# Altium schematic symbol library 场效应管.SchLib: 1062 symbols (part 1 of 4)
Pins are listed as number, name and electrical type; pins without a type are passive.

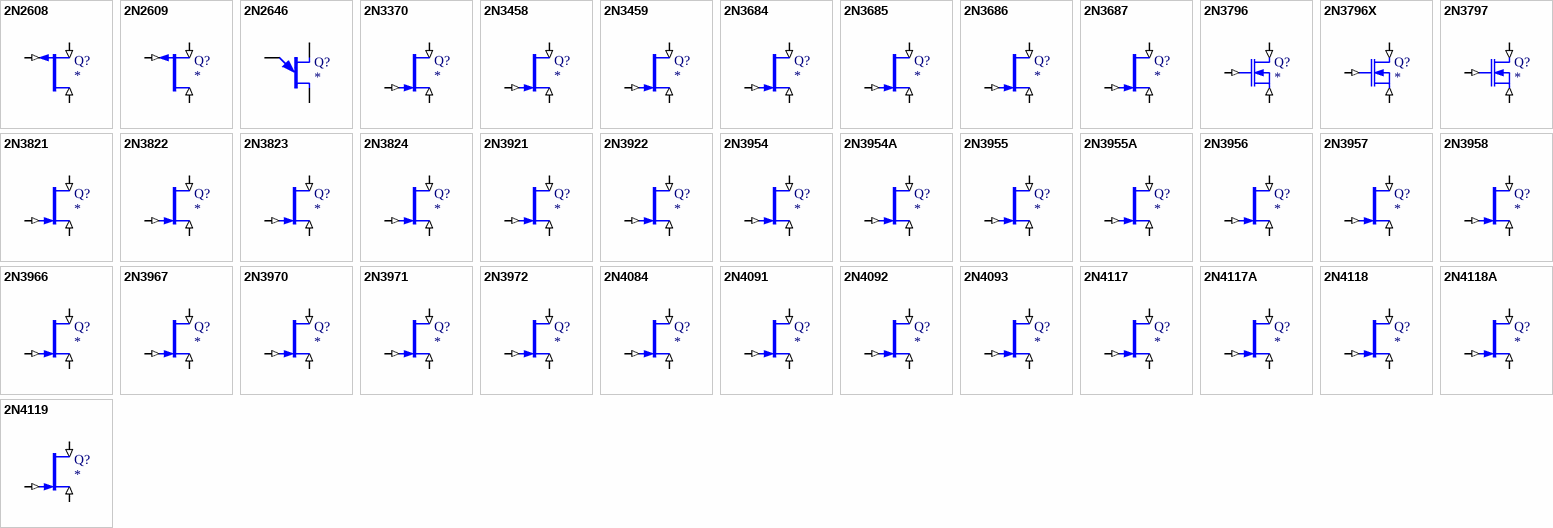
[diagram p0: symbols 2N2608 to 2N4119]

## 2N2608
designator Q?
P-Channel JFET
simulation model 2N2608 (PJFET)
pins: 1 D (in), 2 G (in), 3 S (in)
1 alternate drawing of the same symbol

## 2N2609
designator Q?
P-Channel JFET
simulation model 2N2609 (PJFET)
pins: 1 D (in), 2 G (in), 3 S (in)
1 alternate drawing of the same symbol

## 2N2646
designator Q?
Unijunction Transistor
simulation model 2N2646 (SUBCKT)
pins: 1 B2, 2 E, 3 B1
1 alternate drawing of the same symbol

## 2N3370
designator Q?
N-Channel JFET
simulation model 2N3370 (NJFET)
pins: 1 D (in), 2 G (in), 3 S (in)
1 alternate drawing of the same symbol

## 2N3458
designator Q?
N-Channel JFET
simulation model 2N3458 (NJFET)
pins: 1 D (in), 2 G (in), 3 S (in)
1 alternate drawing of the same symbol

## 2N3459
designator Q?
N-Channel JFET
simulation model 2N3459 (NJFET)
pins: 1 D (in), 2 G (in), 3 S (in)
1 alternate drawing of the same symbol

## 2N3684
designator Q?
N-Channel JFET
simulation model 2N3684 (NJFET)
pins: 1 D (in), 2 G (in), 3 S (in)
1 alternate drawing of the same symbol

## 2N3685
designator Q?
N-Channel JFET
simulation model 2N3685 (NJFET)
pins: 1 D (in), 2 G (in), 3 S (in)
1 alternate drawing of the same symbol

## 2N3686
designator Q?
N-Channel JFET
simulation model 2N3686 (NJFET)
pins: 1 D (in), 2 G (in), 3 S (in)
1 alternate drawing of the same symbol

## 2N3687
designator Q?
N-Channel JFET
simulation model 2N3687 (NJFET)
pins: 1 D (in), 2 G (in), 3 S (in)
1 alternate drawing of the same symbol

## 2N3796
designator Q?
N-Channel MOSFET; TEMP: *
simulation model 2N3796 (NEMOS)
pins: 1 D (in), 2 G (in), 3 S (in)
1 alternate drawing of the same symbol

## 2N3796X
designator Q?
N-Channel MOSFET; TEMP: *
simulation model 2N3796X (NEMOS)
pins: 1 D (in), 2 G (in), 3 S (in)
1 alternate drawing of the same symbol

## 2N3797
designator Q?
N-Channel MOSFET; TEMP: *
simulation model 2N3797 (NEMOS)
pins: 1 D (in), 2 G (in), 3 S (in)
1 alternate drawing of the same symbol

## 2N3821
designator Q?
N-Channel JFET
simulation model 2N3821 (NJFET)
pins: 1 D (in), 2 G (in), 3 S (in)
1 alternate drawing of the same symbol

## 2N3822
designator Q?
N-Channel JFET
simulation model 2N3822 (NJFET)
pins: 1 D (in), 2 G (in), 3 S (in)
1 alternate drawing of the same symbol

## 2N3823
designator Q?
N-Channel JFET
simulation model 2N3823 (NJFET)
pins: 1 D (in), 2 G (in), 3 S (in)
1 alternate drawing of the same symbol

## 2N3824
designator Q?
N-Channel JFET
simulation model 2N3824 (NJFET)
pins: 1 D (in), 2 G (in), 3 S (in)
1 alternate drawing of the same symbol

## 2N3921
designator Q?
N-Channel JFET
simulation model 2N3921 (NJFET)
pins: 1 D (in), 2 G (in), 3 S (in)
1 alternate drawing of the same symbol

## 2N3922
designator Q?
N-Channel JFET
simulation model 2N3922 (NJFET)
pins: 1 D (in), 2 G (in), 3 S (in)
1 alternate drawing of the same symbol

## 2N3954
designator Q?
N-Channel JFET
simulation model 2N3954 (NJFET)
pins: 1 D (in), 2 G (in), 3 S (in)
1 alternate drawing of the same symbol

## 2N3954A
designator Q?
N-Channel JFET
simulation model 2N3954A (NJFET)
pins: 1 D (in), 2 G (in), 3 S (in)
1 alternate drawing of the same symbol

## 2N3955
designator Q?
N-Channel JFET
simulation model 2N3955 (NJFET)
pins: 1 D (in), 2 G (in), 3 S (in)
1 alternate drawing of the same symbol

## 2N3955A
designator Q?
N-Channel JFET
simulation model 2N3955A (NJFET)
pins: 1 D (in), 2 G (in), 3 S (in)
1 alternate drawing of the same symbol

## 2N3956
designator Q?
N-Channel JFET
simulation model 2N3956 (NJFET)
pins: 1 D (in), 2 G (in), 3 S (in)
1 alternate drawing of the same symbol

## 2N3957
designator Q?
N-Channel JFET
simulation model 2N3957 (NJFET)
pins: 1 D (in), 2 G (in), 3 S (in)
1 alternate drawing of the same symbol

## 2N3958
designator Q?
N-Channel JFET
simulation model 2N3958 (NJFET)
pins: 1 D (in), 2 G (in), 3 S (in)
1 alternate drawing of the same symbol

## 2N3966
designator Q?
N-Channel JFET
simulation model 2N3966 (NJFET)
pins: 1 D (in), 2 G (in), 3 S (in)
1 alternate drawing of the same symbol

## 2N3967
designator Q?
N-Channel JFET
simulation model 2N3967 (NJFET)
pins: 1 D (in), 2 G (in), 3 S (in)
1 alternate drawing of the same symbol

## 2N3970
designator Q?
N-Channel JFET
simulation model 2N3970 (NJFET)
pins: 1 D (in), 2 G (in), 3 S (in)
1 alternate drawing of the same symbol

## 2N3971
designator Q?
N-Channel JFET
simulation model 2N3971 (NJFET)
pins: 1 D (in), 2 G (in), 3 S (in)
1 alternate drawing of the same symbol

## 2N3972
designator Q?
N-Channel JFET
simulation model 2N3972 (NJFET)
pins: 1 D (in), 2 G (in), 3 S (in)
1 alternate drawing of the same symbol

## 2N4084
designator Q?
N-Channel JFET
simulation model 2N4084 (NJFET)
pins: 1 D (in), 2 G (in), 3 S (in)
1 alternate drawing of the same symbol

## 2N4091
designator Q?
N-Channel JFET
simulation model 2N4091 (NJFET)
pins: 1 D (in), 2 G (in), 3 S (in)
1 alternate drawing of the same symbol

## 2N4092
designator Q?
N-Channel JFET
simulation model 2N4092 (NJFET)
pins: 1 D (in), 2 G (in), 3 S (in)
1 alternate drawing of the same symbol

## 2N4093
designator Q?
N-Channel JFET
simulation model 2N4093 (NJFET)
pins: 1 D (in), 2 G (in), 3 S (in)
1 alternate drawing of the same symbol

## 2N4117
designator Q?
N-Channel JFET
simulation model 2N4117 (NJFET)
pins: 1 D (in), 2 G (in), 3 S (in)
1 alternate drawing of the same symbol

## 2N4117A
designator Q?
N-Channel JFET
simulation model 2N4117A (NJFET)
pins: 1 D (in), 2 G (in), 3 S (in)
1 alternate drawing of the same symbol

## 2N4118
designator Q?
N-Channel JFET
simulation model 2N4118 (NJFET)
pins: 1 D (in), 2 G (in), 3 S (in)
1 alternate drawing of the same symbol

## 2N4118A
designator Q?
N-Channel JFET
simulation model 2N4118A (NJFET)
pins: 1 D (in), 2 G (in), 3 S (in)
1 alternate drawing of the same symbol

## 2N4119
designator Q?
N-Channel JFET
simulation model 2N4119 (NJFET)
pins: 1 D (in), 2 G (in), 3 S (in)
1 alternate drawing of the same symbol

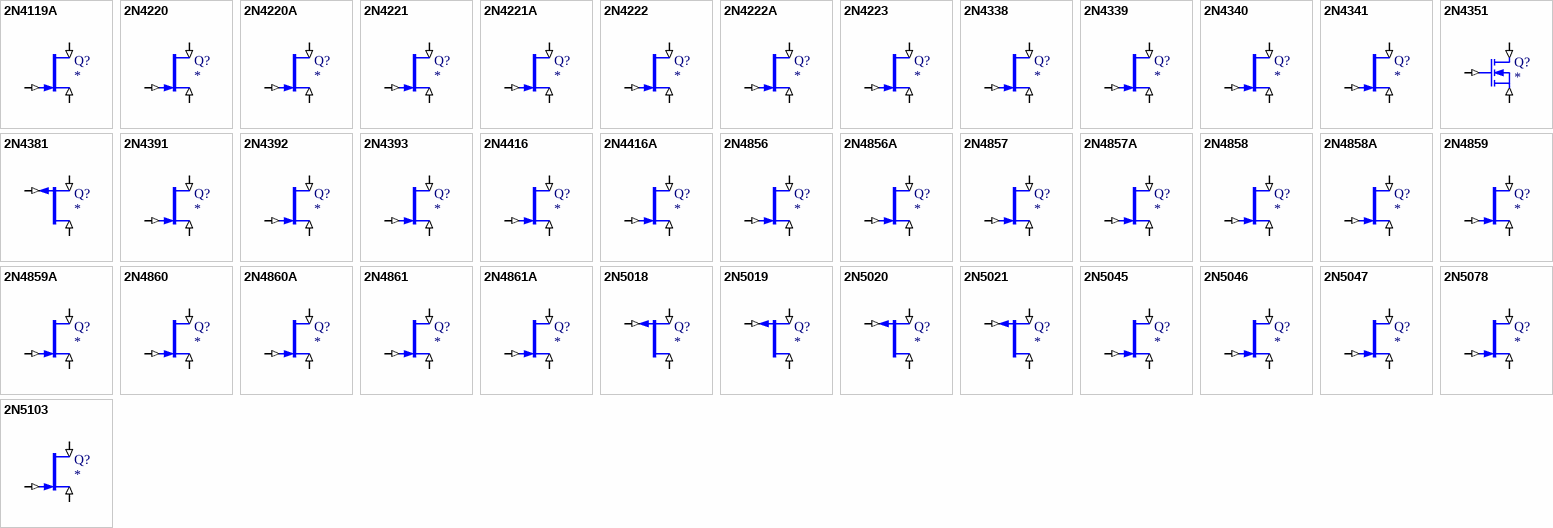
[diagram p1: symbols 2N4119A to 2N5103]

## 2N4119A
designator Q?
N-Channel JFET
simulation model 2N4119A (NJFET)
pins: 1 D (in), 2 G (in), 3 S (in)
1 alternate drawing of the same symbol

## 2N4220
designator Q?
N-Channel JFET
simulation model 2N4220 (NJFET)
pins: 1 D (in), 2 G (in), 3 S (in)
1 alternate drawing of the same symbol

## 2N4220A
designator Q?
N-Channel JFET
simulation model 2N4220A (NJFET)
pins: 1 D (in), 2 G (in), 3 S (in)
1 alternate drawing of the same symbol

## 2N4221
designator Q?
N-Channel JFET
simulation model 2N4221 (NJFET)
pins: 1 D (in), 2 G (in), 3 S (in)
1 alternate drawing of the same symbol

## 2N4221A
designator Q?
N-Channel JFET
simulation model 2N4221A (NJFET)
pins: 1 D (in), 2 G (in), 3 S (in)
1 alternate drawing of the same symbol

## 2N4222
designator Q?
N-Channel JFET
simulation model 2N4222 (NJFET)
pins: 1 D (in), 2 G (in), 3 S (in)
1 alternate drawing of the same symbol

## 2N4222A
designator Q?
N-Channel JFET
simulation model 2N4222A (NJFET)
pins: 1 D (in), 2 G (in), 3 S (in)
1 alternate drawing of the same symbol

## 2N4223
designator Q?
N-Channel JFET
simulation model 2N4223 (NJFET)
pins: 1 D (in), 2 G (in), 3 S (in)
1 alternate drawing of the same symbol

## 2N4338
designator Q?
N-Channel JFET
simulation model 2N4338 (NJFET)
pins: 1 D (in), 2 G (in), 3 S (in)
1 alternate drawing of the same symbol

## 2N4339
designator Q?
N-Channel JFET
simulation model 2N4339 (NJFET)
pins: 1 D (in), 2 G (in), 3 S (in)
1 alternate drawing of the same symbol

## 2N4340
designator Q?
N-Channel JFET
simulation model 2N4340 (NJFET)
pins: 1 D (in), 2 G (in), 3 S (in)
1 alternate drawing of the same symbol

## 2N4341
designator Q?
N-Channel JFET
simulation model 2N4341 (NJFET)
pins: 1 D (in), 2 G (in), 3 S (in)
1 alternate drawing of the same symbol

## 2N4351
designator Q?
N-Channel MOSFET; TEMP: *
simulation model 2N4351 (NEMOS)
pins: 1 D (in), 2 G (in), 3 S (in)
1 alternate drawing of the same symbol

## 2N4381
designator Q?
P-Channel JFET
simulation model 2N4381 (PJFET)
pins: 1 D (in), 2 G (in), 3 S (in)
1 alternate drawing of the same symbol

## 2N4391
designator Q?
N-Channel JFET
simulation model 2N4391 (NJFET)
pins: 1 D (in), 2 G (in), 3 S (in)
1 alternate drawing of the same symbol

## 2N4392
designator Q?
N-Channel JFET
simulation model 2N4392 (NJFET)
pins: 1 D (in), 2 G (in), 3 S (in)
1 alternate drawing of the same symbol

## 2N4393
designator Q?
N-Channel JFET
simulation model 2N4393 (NJFET)
pins: 1 D (in), 2 G (in), 3 S (in)
1 alternate drawing of the same symbol

## 2N4416
designator Q?
N-Channel JFET
simulation model 2N4416 (NJFET)
pins: 1 D (in), 2 G (in), 3 S (in)
1 alternate drawing of the same symbol

## 2N4416A
designator Q?
N-Channel JFET
simulation model 2N4416A (NJFET)
pins: 1 D (in), 2 G (in), 3 S (in)
1 alternate drawing of the same symbol

## 2N4856
designator Q?
N-Channel JFET
simulation model 2N4856 (NJFET)
pins: 1 D (in), 2 G (in), 3 S (in)
1 alternate drawing of the same symbol

## 2N4856A
designator Q?
N-Channel JFET
simulation model 2N4856A (NJFET)
pins: 1 D (in), 2 G (in), 3 S (in)
1 alternate drawing of the same symbol

## 2N4857
designator Q?
N-Channel JFET
simulation model 2N4857 (NJFET)
pins: 1 D (in), 2 G (in), 3 S (in)
1 alternate drawing of the same symbol

## 2N4857A
designator Q?
N-Channel JFET
simulation model 2N4857A (NJFET)
pins: 1 D (in), 2 G (in), 3 S (in)
1 alternate drawing of the same symbol

## 2N4858
designator Q?
N-Channel JFET
simulation model 2N4858 (NJFET)
pins: 1 D (in), 2 G (in), 3 S (in)
1 alternate drawing of the same symbol

## 2N4858A
designator Q?
N-Channel JFET
simulation model 2N4858A (NJFET)
pins: 1 D (in), 2 G (in), 3 S (in)
1 alternate drawing of the same symbol

## 2N4859
designator Q?
N-Channel JFET
simulation model 2N4859 (NJFET)
pins: 1 D (in), 2 G (in), 3 S (in)
1 alternate drawing of the same symbol

## 2N4859A
designator Q?
N-Channel JFET
simulation model 2N4859A (NJFET)
pins: 1 D (in), 2 G (in), 3 S (in)
1 alternate drawing of the same symbol

## 2N4860
designator Q?
N-Channel JFET
simulation model 2N4860 (NJFET)
pins: 1 D (in), 2 G (in), 3 S (in)
1 alternate drawing of the same symbol

## 2N4860A
designator Q?
N-Channel JFET
simulation model 2N4860A (NJFET)
pins: 1 D (in), 2 G (in), 3 S (in)
1 alternate drawing of the same symbol

## 2N4861
designator Q?
N-Channel JFET
simulation model 2N4861 (NJFET)
pins: 1 D (in), 2 G (in), 3 S (in)
1 alternate drawing of the same symbol

## 2N4861A
designator Q?
N-Channel JFET
simulation model 2N4861A (NJFET)
pins: 1 D (in), 2 G (in), 3 S (in)
1 alternate drawing of the same symbol

## 2N5018
designator Q?
P-Channel JFET
simulation model 2N5018 (PJFET)
pins: 1 D (in), 2 G (in), 3 S (in)
1 alternate drawing of the same symbol

## 2N5019
designator Q?
P-Channel JFET
simulation model 2N5019 (PJFET)
pins: 1 D (in), 2 G (in), 3 S (in)
1 alternate drawing of the same symbol

## 2N5020
designator Q?
P-Channel JFET
simulation model 2N5020 (PJFET)
pins: 1 D (in), 2 G (in), 3 S (in)
1 alternate drawing of the same symbol

## 2N5021
designator Q?
P-Channel JFET
simulation model 2N5021 (PJFET)
pins: 1 D (in), 2 G (in), 3 S (in)
1 alternate drawing of the same symbol

## 2N5045
designator Q?
N-Channel JFET
simulation model 2N5045 (NJFET)
pins: 1 D (in), 2 G (in), 3 S (in)
1 alternate drawing of the same symbol

## 2N5046
designator Q?
N-Channel JFET
simulation model 2N5046 (NJFET)
pins: 1 D (in), 2 G (in), 3 S (in)
1 alternate drawing of the same symbol

## 2N5047
designator Q?
N-Channel JFET
simulation model 2N5047 (NJFET)
pins: 1 D (in), 2 G (in), 3 S (in)
1 alternate drawing of the same symbol

## 2N5078
designator Q?
N-Channel JFET
simulation model 2N5078 (NJFET)
pins: 1 D (in), 2 G (in), 3 S (in)
1 alternate drawing of the same symbol

## 2N5103
designator Q?
N-Channel JFET
simulation model 2N5103 (NJFET)
pins: 1 D (in), 2 G (in), 3 S (in)
1 alternate drawing of the same symbol

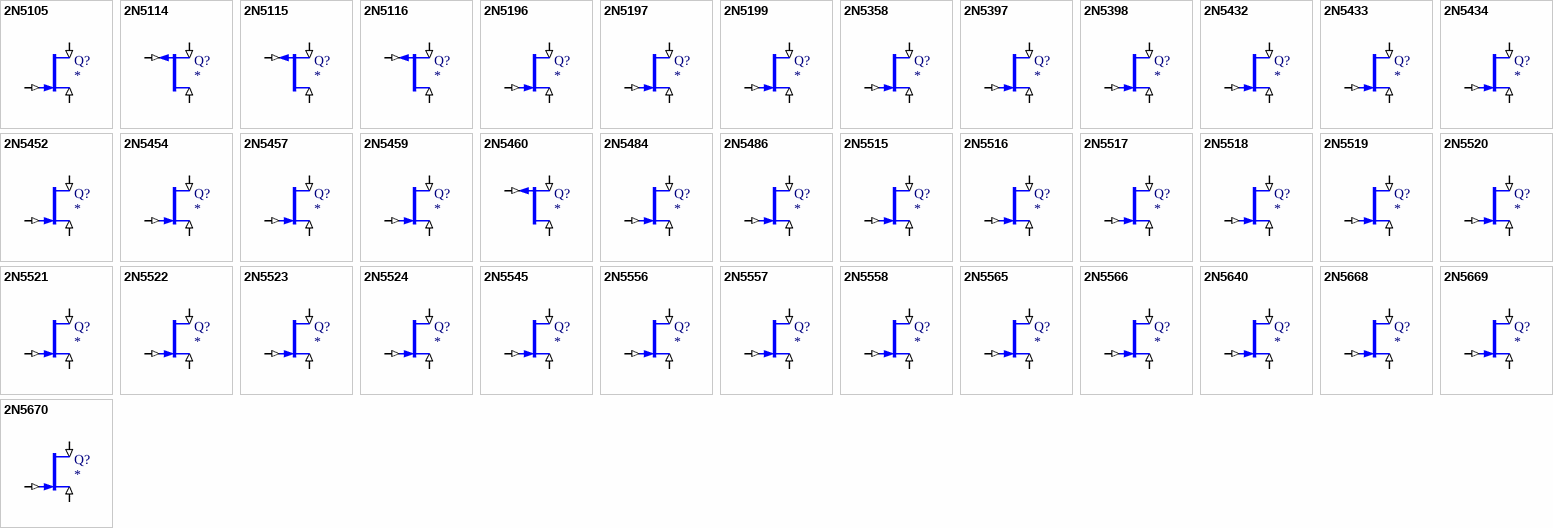
[diagram p2: symbols 2N5105 to 2N5670]

## 2N5105
designator Q?
N-Channel JFET
simulation model 2N5105 (NJFET)
pins: 1 D (in), 2 G (in), 3 S (in)
1 alternate drawing of the same symbol

## 2N5114
designator Q?
P-Channel JFET
simulation model 2N5114 (PJFET)
pins: 1 D (in), 2 G (in), 3 S (in)
1 alternate drawing of the same symbol

## 2N5115
designator Q?
P-Channel JFET
simulation model 2N5115 (PJFET)
pins: 1 D (in), 2 G (in), 3 S (in)
1 alternate drawing of the same symbol

## 2N5116
designator Q?
P-Channel JFET
simulation model 2N5116 (PJFET)
pins: 1 D (in), 2 G (in), 3 S (in)
1 alternate drawing of the same symbol

## 2N5196
designator Q?
N-Channel JFET
simulation model 2N5196 (NJFET)
pins: 1 D (in), 2 G (in), 3 S (in)
1 alternate drawing of the same symbol

## 2N5197
designator Q?
N-Channel JFET
simulation model 2N5197 (NJFET)
pins: 1 D (in), 2 G (in), 3 S (in)
1 alternate drawing of the same symbol

## 2N5199
designator Q?
N-Channel JFET
simulation model 2N5199 (NJFET)
pins: 1 D (in), 2 G (in), 3 S (in)
1 alternate drawing of the same symbol

## 2N5358
designator Q?
N-Channel JFET
simulation model 2N5358 (NJFET)
pins: 1 D (in), 2 G (in), 3 S (in)
1 alternate drawing of the same symbol

## 2N5397
designator Q?
N-Channel JFET
simulation model 2N5397 (NJFET)
pins: 1 D (in), 2 G (in), 3 S (in)
1 alternate drawing of the same symbol

## 2N5398
designator Q?
N-Channel JFET
simulation model 2N5398 (NJFET)
pins: 1 D (in), 2 G (in), 3 S (in)
1 alternate drawing of the same symbol

## 2N5432
designator Q?
N-Channel JFET
simulation model 2N5432 (NJFET)
pins: 1 D (in), 2 G (in), 3 S (in)
1 alternate drawing of the same symbol

## 2N5433
designator Q?
N-Channel JFET
simulation model 2N5433 (NJFET)
pins: 1 D (in), 2 G (in), 3 S (in)
1 alternate drawing of the same symbol

## 2N5434
designator Q?
N-Channel JFET
simulation model 2N5434 (NJFET)
pins: 1 D (in), 2 G (in), 3 S (in)
1 alternate drawing of the same symbol

## 2N5452
designator Q?
N-Channel JFET
simulation model 2N5452 (NJFET)
pins: 1 D (in), 2 G (in), 3 S (in)
1 alternate drawing of the same symbol

## 2N5454
designator Q?
N-Channel JFET
simulation model 2N5454 (NJFET)
pins: 1 D (in), 2 G (in), 3 S (in)
1 alternate drawing of the same symbol

## 2N5457
designator Q?
N-Channel JFET
simulation model 2N5457 (NJFET)
pins: 1 D (in), 2 G (in), 3 S (in)
1 alternate drawing of the same symbol

## 2N5459
designator Q?
N-Channel JFET
simulation model 2N5459 (NJFET)
pins: 1 D (in), 2 G (in), 3 S (in)
1 alternate drawing of the same symbol

## 2N5460
designator Q?
P-Channel JFET
simulation model 2N5460 (PJFET)
pins: 1 D (in), 2 G (in), 3 S (in)
1 alternate drawing of the same symbol

## 2N5484
designator Q?
N-Channel JFET
simulation model 2N5484 (NJFET)
pins: 1 D (in), 2 G (in), 3 S (in)
1 alternate drawing of the same symbol

## 2N5486
designator Q?
N-Channel JFET
simulation model 2N5486 (NJFET)
pins: 1 D (in), 2 G (in), 3 S (in)
1 alternate drawing of the same symbol

## 2N5515
designator Q?
N-Channel JFET
simulation model 2N5515 (NJFET)
pins: 1 D (in), 2 G (in), 3 S (in)
1 alternate drawing of the same symbol

## 2N5516
designator Q?
N-Channel JFET
simulation model 2N5516 (NJFET)
pins: 1 D (in), 2 G (in), 3 S (in)
1 alternate drawing of the same symbol

## 2N5517
designator Q?
N-Channel JFET
simulation model 2N5517 (NJFET)
pins: 1 D (in), 2 G (in), 3 S (in)
1 alternate drawing of the same symbol

## 2N5518
designator Q?
N-Channel JFET
simulation model 2N5518 (NJFET)
pins: 1 D (in), 2 G (in), 3 S (in)
1 alternate drawing of the same symbol

## 2N5519
designator Q?
N-Channel JFET
simulation model 2N5519 (NJFET)
pins: 1 D (in), 2 G (in), 3 S (in)
1 alternate drawing of the same symbol

## 2N5520
designator Q?
N-Channel JFET
simulation model 2N5520 (NJFET)
pins: 1 D (in), 2 G (in), 3 S (in)
1 alternate drawing of the same symbol

## 2N5521
designator Q?
N-Channel JFET
simulation model 2N5521 (NJFET)
pins: 1 D (in), 2 G (in), 3 S (in)
1 alternate drawing of the same symbol

## 2N5522
designator Q?
N-Channel JFET
simulation model 2N5522 (NJFET)
pins: 1 D (in), 2 G (in), 3 S (in)
1 alternate drawing of the same symbol

## 2N5523
designator Q?
N-Channel JFET
simulation model 2N5523 (NJFET)
pins: 1 D (in), 2 G (in), 3 S (in)
1 alternate drawing of the same symbol

## 2N5524
designator Q?
N-Channel JFET
simulation model 2N5524 (NJFET)
pins: 1 D (in), 2 G (in), 3 S (in)
1 alternate drawing of the same symbol

## 2N5545
designator Q?
N-Channel JFET
simulation model 2N5545 (NJFET)
pins: 1 D (in), 2 G (in), 3 S (in)
1 alternate drawing of the same symbol

## 2N5556
designator Q?
N-Channel JFET
simulation model 2N5556 (NJFET)
pins: 1 D (in), 2 G (in), 3 S (in)
1 alternate drawing of the same symbol

## 2N5557
designator Q?
N-Channel JFET
simulation model 2N5557 (NJFET)
pins: 1 D (in), 2 G (in), 3 S (in)
1 alternate drawing of the same symbol

## 2N5558
designator Q?
N-Channel JFET
simulation model 2N5558 (NJFET)
pins: 1 D (in), 2 G (in), 3 S (in)
1 alternate drawing of the same symbol

## 2N5565
designator Q?
N-Channel JFET
simulation model 2N5565 (NJFET)
pins: 1 D (in), 2 G (in), 3 S (in)
1 alternate drawing of the same symbol

## 2N5566
designator Q?
N-Channel JFET
simulation model 2N5566 (NJFET)
pins: 1 D (in), 2 G (in), 3 S (in)
1 alternate drawing of the same symbol

## 2N5640
designator Q?
N-Channel JFET
simulation model 2N5640 (NJFET)
pins: 1 D (in), 2 G (in), 3 S (in)
1 alternate drawing of the same symbol

## 2N5668
designator Q?
N-Channel JFET
simulation model 2N5668 (NJFET)
pins: 1 D (in), 2 G (in), 3 S (in)
1 alternate drawing of the same symbol

## 2N5669
designator Q?
N-Channel JFET
simulation model 2N5669 (NJFET)
pins: 1 D (in), 2 G (in), 3 S (in)
1 alternate drawing of the same symbol

## 2N5670
designator Q?
N-Channel JFET
simulation model 2N5670 (NJFET)
pins: 1 D (in), 2 G (in), 3 S (in)
1 alternate drawing of the same symbol

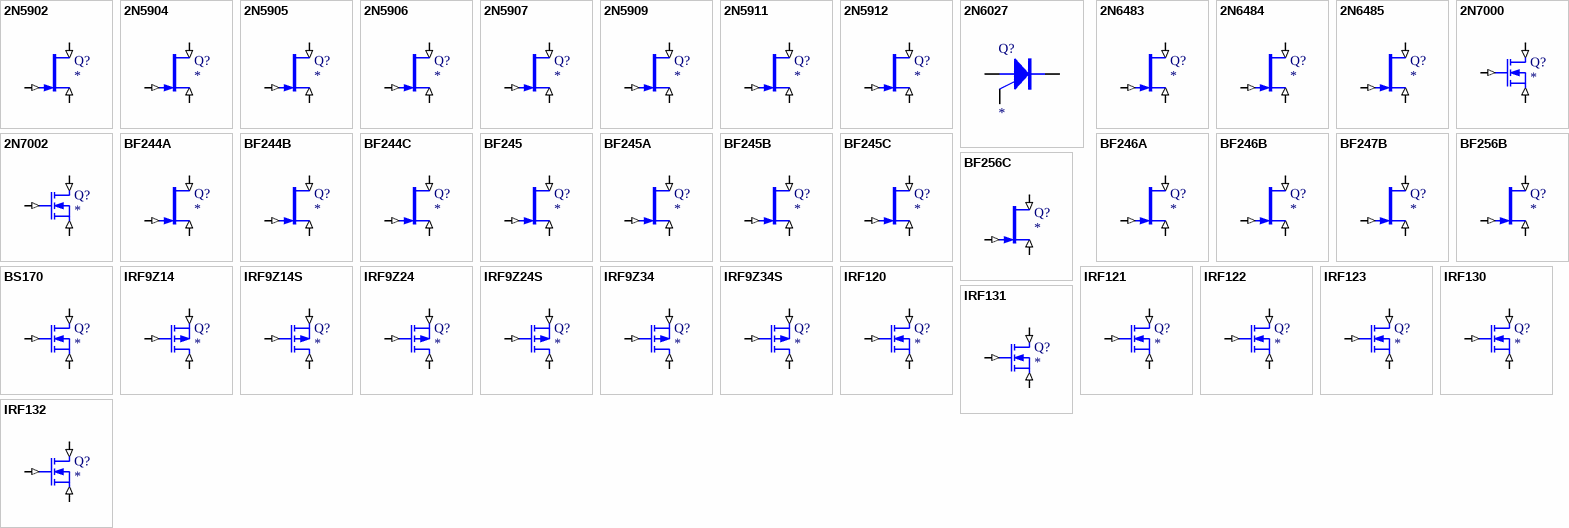
[diagram p3: symbols 2N5902 to IRF132]

## 2N5902
designator Q?
N-Channel JFET
simulation model 2N5902 (NJFET)
pins: 1 D (in), 2 G (in), 3 S (in)
1 alternate drawing of the same symbol

## 2N5904
designator Q?
N-Channel JFET
simulation model 2N5904 (NJFET)
pins: 1 D (in), 2 G (in), 3 S (in)
1 alternate drawing of the same symbol

## 2N5905
designator Q?
N-Channel JFET
simulation model 2N5905 (NJFET)
pins: 1 D (in), 2 G (in), 3 S (in)
1 alternate drawing of the same symbol

## 2N5906
designator Q?
N-Channel JFET
simulation model 2N5906 (NJFET)
pins: 1 D (in), 2 G (in), 3 S (in)
1 alternate drawing of the same symbol

## 2N5907
designator Q?
N-Channel JFET
simulation model 2N5907 (NJFET)
pins: 1 D (in), 2 G (in), 3 S (in)
1 alternate drawing of the same symbol

## 2N5909
designator Q?
N-Channel JFET
simulation model 2N5909 (NJFET)
pins: 1 D (in), 2 G (in), 3 S (in)
1 alternate drawing of the same symbol

## 2N5911
designator Q?
N-Channel JFET
simulation model 2N5911 (NJFET)
pins: 1 D (in), 2 G (in), 3 S (in)
1 alternate drawing of the same symbol

## 2N5912
designator Q?
N-Channel JFET
simulation model 2N5912 (NJFET)
pins: 1 D (in), 2 G (in), 3 S (in)
1 alternate drawing of the same symbol

## 2N6027
designator Q?
Programmable Unijunction Transistor
simulation model 2N6027 (SUBCKT)
pins: 1 A, 2 G, 3 K
1 alternate drawing of the same symbol

## 2N6483
designator Q?
N-Channel JFET
simulation model 2N6483 (NJFET)
pins: 1 D (in), 2 G (in), 3 S (in)
1 alternate drawing of the same symbol

## 2N6484
designator Q?
N-Channel JFET
simulation model 2N6484 (NJFET)
pins: 1 D (in), 2 G (in), 3 S (in)
1 alternate drawing of the same symbol

## 2N6485
designator Q?
N-Channel JFET
simulation model 2N6485 (NJFET)
pins: 1 D (in), 2 G (in), 3 S (in)
1 alternate drawing of the same symbol

## 2N7000
designator Q?
N-Channel MOSFET
simulation model 2N7000 (SUBCKT)
pins: 1 D (in), 2 G (in), 3 S (in)
1 alternate drawing of the same symbol

## 2N7002
designator Q?
N-Channel MOSFET
simulation model 2N7002 (SUBCKT)
pins: 1 D (in), 2 G (in), 3 S (in)
1 alternate drawing of the same symbol

## BF244A
designator Q?
N-Channel JFET
simulation model BF244A (NJFET)
pins: 1 D (in), 2 G (in), 3 S (in)
1 alternate drawing of the same symbol

## BF244B
designator Q?
N-Channel JFET
simulation model BF244B (NJFET)
pins: 1 D (in), 2 G (in), 3 S (in)
1 alternate drawing of the same symbol

## BF244C
designator Q?
N-Channel JFET
simulation model BF244C (NJFET)
pins: 1 D (in), 2 G (in), 3 S (in)
1 alternate drawing of the same symbol

## BF245
designator Q?
N-Channel JFET
simulation model BF245 (NJFET)
pins: 1 D (in), 2 G (in), 3 S (in)
1 alternate drawing of the same symbol

## BF245A
designator Q?
N-Channel JFET
simulation model BF245A (NJFET)
pins: 1 D (in), 2 G (in), 3 S (in)
1 alternate drawing of the same symbol

## BF245B
designator Q?
N-Channel JFET
simulation model BF245B (NJFET)
pins: 1 D (in), 2 G (in), 3 S (in)
1 alternate drawing of the same symbol

## BF245C
designator Q?
N-Channel JFET
simulation model BF245C (NJFET)
pins: 1 D (in), 2 G (in), 3 S (in)
1 alternate drawing of the same symbol

## BF246A
designator Q?
N-Channel JFET
simulation model BF246A (NJFET)
pins: 1 D (in), 2 G (in), 3 S (in)
1 alternate drawing of the same symbol

## BF246B
designator Q?
N-Channel JFET
simulation model BF246B (NJFET)
pins: 1 D (in), 2 G (in), 3 S (in)
1 alternate drawing of the same symbol

## BF247B
designator Q?
N-Channel JFET
simulation model BF247B (NJFET)
pins: 1 D (in), 2 G (in), 3 S (in)
1 alternate drawing of the same symbol

## BF256B
designator Q?
N-Channel JFET
simulation model BF256B (NJFET)
pins: 1 D (in), 2 G (in), 3 S (in)
1 alternate drawing of the same symbol

## BF256C
designator Q?
N-Channel JFET
simulation model BF256C (NJFET)
pins: 1 D (in), 2 G (in), 3 S (in)
1 alternate drawing of the same symbol

## BS170
designator Q?
N-Channel MOSFET
simulation model BS170 (SUBCKT)
pins: 1 D (in), 2 G (in), 3 S (in)
1 alternate drawing of the same symbol

## IRF9Z14
designator Q?
P-Channel MOSFET
simulation model IRF9Z14 (SUBCKT)
pins: 1 D (in), 2 G (in), 3 S (in)
1 alternate drawing of the same symbol

## IRF9Z14S
designator Q?
P-Channel MOSFET
simulation model IRF9Z14S (SUBCKT)
pins: 1 D (in), 2 G (in), 3 S (in)
1 alternate drawing of the same symbol

## IRF9Z24
designator Q?
P-Channel MOSFET
simulation model IRF9Z24 (SUBCKT)
pins: 1 D (in), 2 G (in), 3 S (in)
1 alternate drawing of the same symbol

## IRF9Z24S
designator Q?
P-Channel MOSFET
simulation model IRF9Z24S (SUBCKT)
pins: 1 D (in), 2 G (in), 3 S (in)
1 alternate drawing of the same symbol

## IRF9Z34
designator Q?
P-Channel MOSFET
simulation model IRF9Z34 (SUBCKT)
pins: 1 D (in), 2 G (in), 3 S (in)
1 alternate drawing of the same symbol

## IRF9Z34S
designator Q?
P-Channel MOSFET
simulation model IRF9Z34S (SUBCKT)
pins: 1 D (in), 2 G (in), 3 S (in)
1 alternate drawing of the same symbol

## IRF120
designator Q?
N-Channel MOSFET
simulation model IRF120 (SUBCKT)
pins: 1 D (in), 2 G (in), 3 S (in)
1 alternate drawing of the same symbol

## IRF121
designator Q?
N-Channel MOSFET
simulation model IRF121 (SUBCKT)
pins: 1 D (in), 2 G (in), 3 S (in)
1 alternate drawing of the same symbol

## IRF122
designator Q?
N-Channel MOSFET
simulation model IRF122 (SUBCKT)
pins: 1 D (in), 2 G (in), 3 S (in)
1 alternate drawing of the same symbol

## IRF123
designator Q?
N-Channel MOSFET
simulation model IRF123 (SUBCKT)
pins: 1 D (in), 2 G (in), 3 S (in)
1 alternate drawing of the same symbol

## IRF130
designator Q?
N-Channel MOSFET
simulation model IRF130 (SUBCKT)
pins: 1 D (in), 2 G (in), 3 S (in)
1 alternate drawing of the same symbol

## IRF131
designator Q?
N-Channel MOSFET
simulation model IRF131 (SUBCKT)
pins: 1 D (in), 2 G (in), 3 S (in)
1 alternate drawing of the same symbol

## IRF132
designator Q?
N-Channel MOSFET
simulation model IRF132 (SUBCKT)
pins: 1 D (in), 2 G (in), 3 S (in)
1 alternate drawing of the same symbol

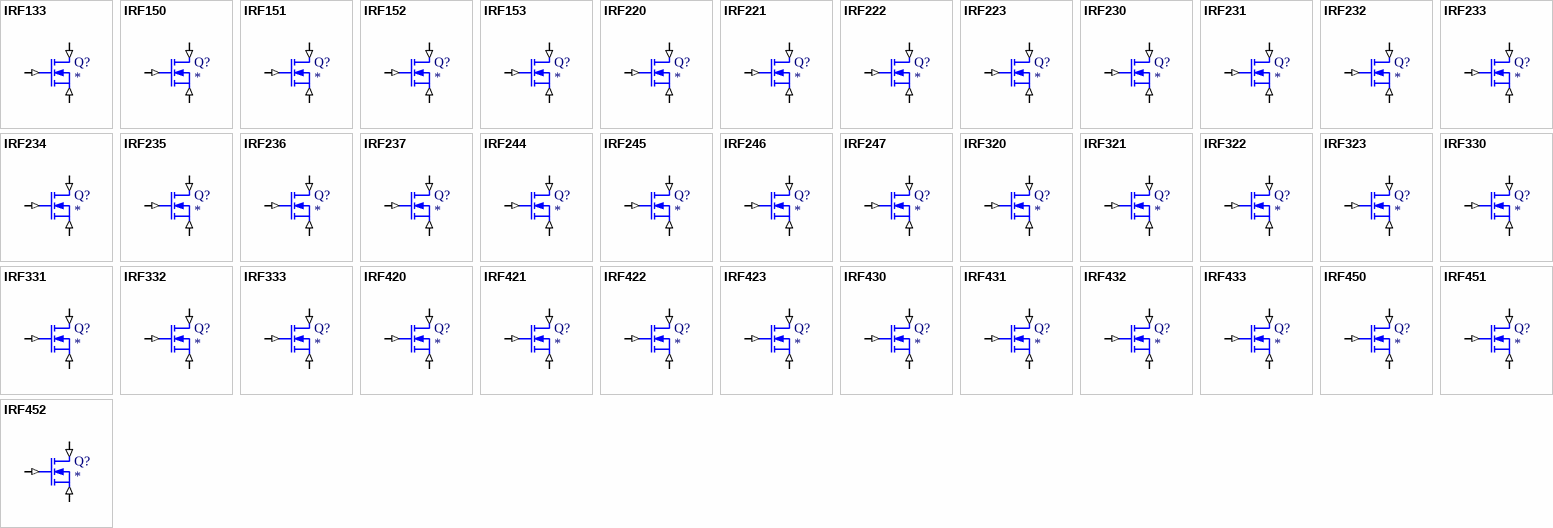
[diagram p4: symbols IRF133 to IRF452]

## IRF133
designator Q?
N-Channel MOSFET
simulation model IRF133 (SUBCKT)
pins: 1 D (in), 2 G (in), 3 S (in)
1 alternate drawing of the same symbol